# Altium schematic symbol library FPGA_Xilinx_Virtex6.SchLib: 28 symbols (part 1 of 15) (continued)
## XC6VHX250T-FF1154 (continued)
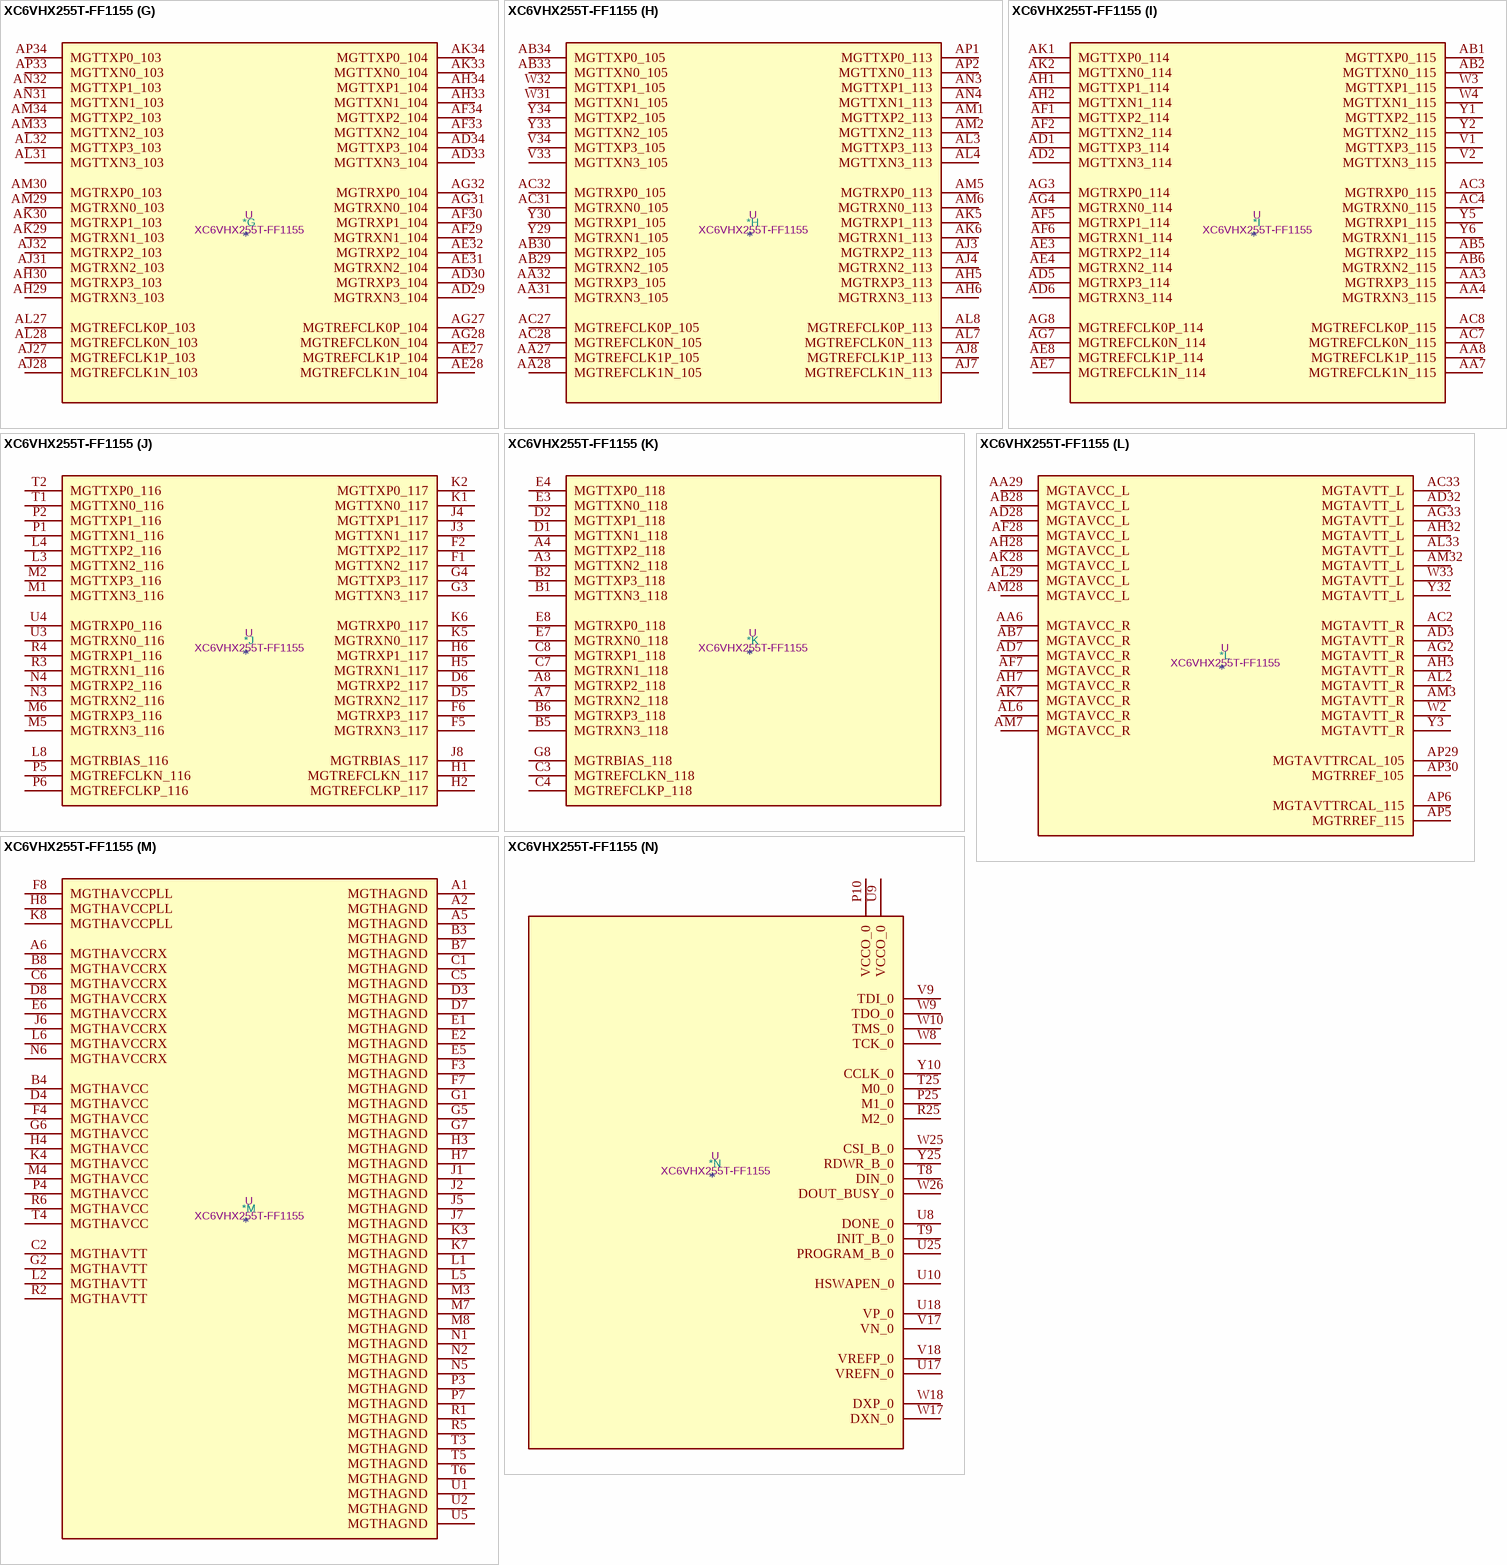
[diagram p4: symbol XC6VHX255T-FF1155]

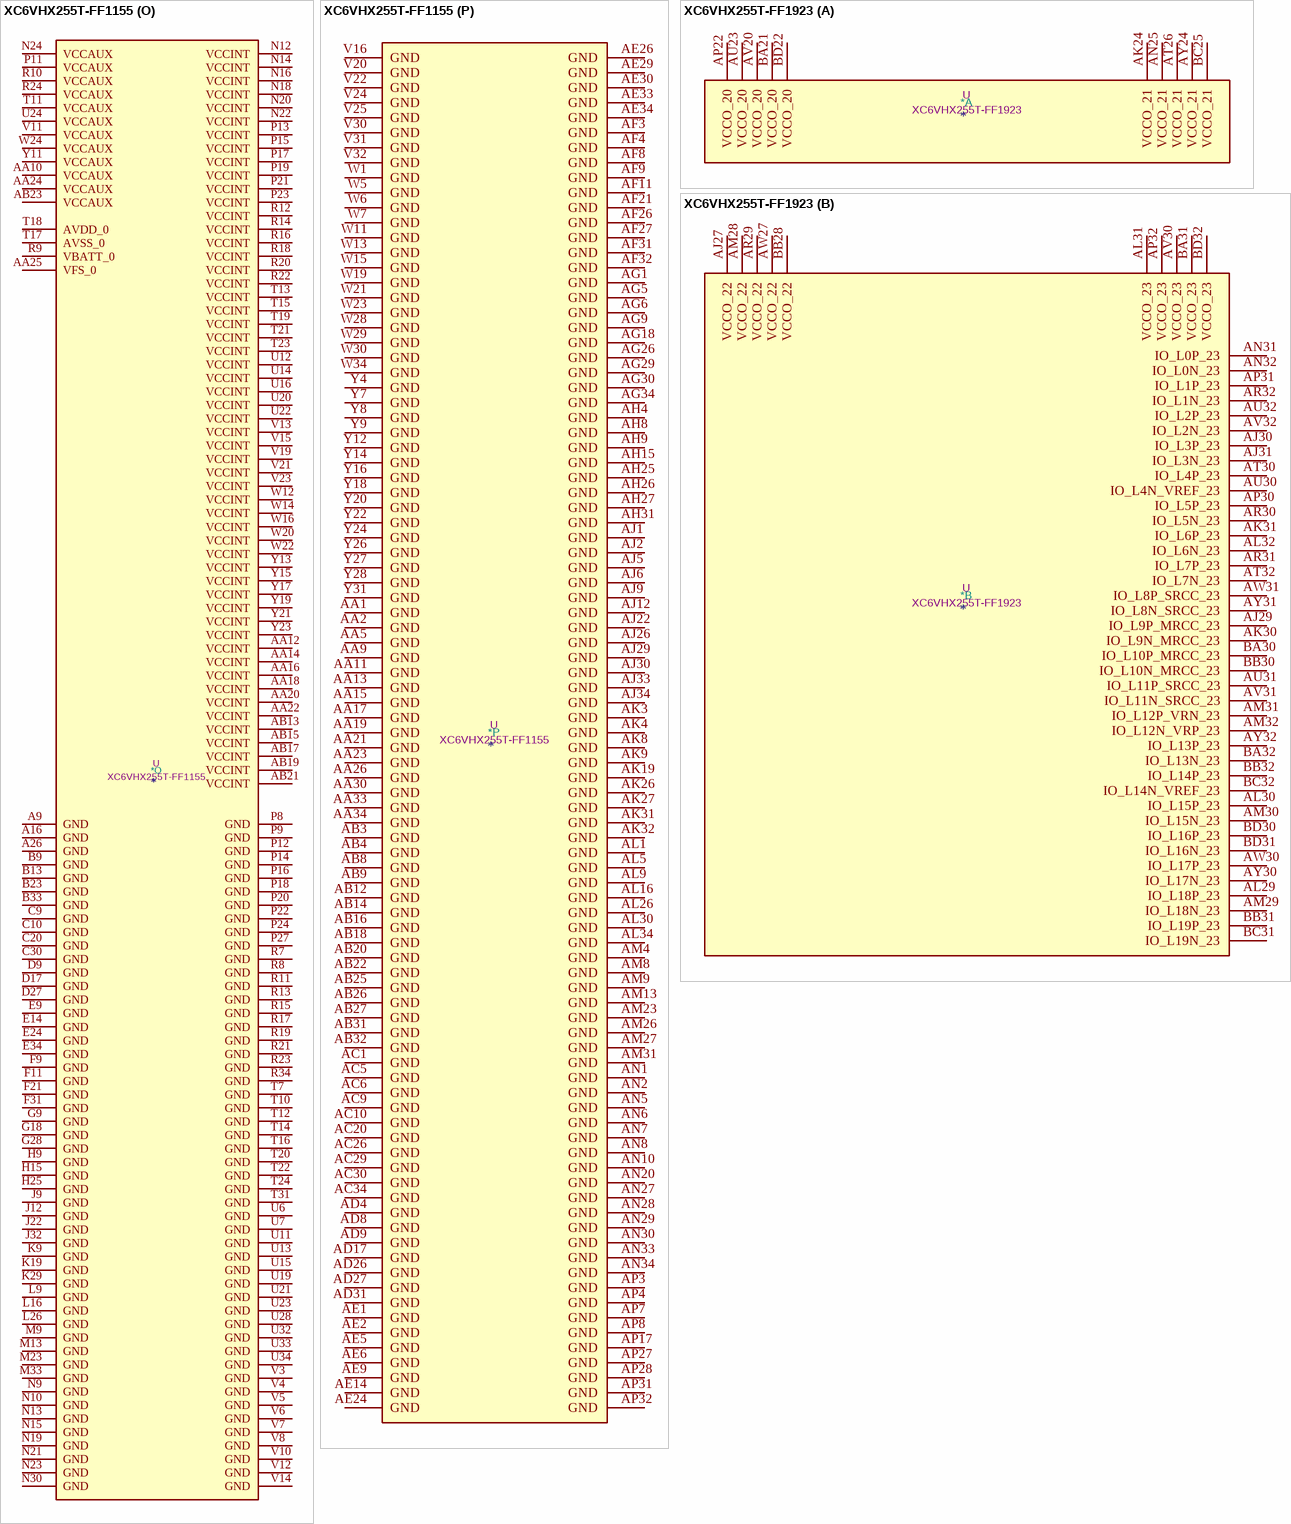
[diagram p5: symbols XC6VHX255T-FF1155 to XC6VHX255T-FF1923]

## XC6VHX255T-FF1155
designator *  value XC6VHX255T-FF1155  Reference: U
ki_keywords: FPGA; ki_description: Virtex 6 HXT 255 XC6VHX255T-FF1155
part A pins: AB24 IO_L4P_D11_24, AC18 IO_L19P_23, AC19 IO_L19N_23, AC21 IO_L4P_23, AC22 IO_L7P_D5_24, AC23 IO_L7N_D4_24, AC24 IO_L4N_VREF_D10_24, AC25 VCCO_24, AD18 IO_L17P_23, AD19 IO_L12P_VRN_23, AD20 IO_L12N_VRP_23, AD21 IO_L4N_VREF_23, AD22 VCCO_24, AD23 IO_L5P_D9_24, AD24 IO_L19P_24, AD25 IO_L19N_24, AE18 IO_L17N_23, AE19 VCCO_23, AE20 IO_L5P_23, AE21 IO_L5N_23, AE22 IO_L9P_MRCC_24, AE23 IO_L5N_D8_24, AE25 IO_L0P_GC_24, AF18 IO_L13P_23, AF19 IO_L13N_23, AF20 IO_L10P_MRCC_23, AF22 IO_L17P_VRN_24, AF23 IO_L9N_MRCC_24, AF24 IO_L2P_D15_24, AF25 IO_L0N_GC_24, AG19 IO_L9P_MRCC_23, AG20 IO_L10N_MRCC_23, AG21 IO_L1P_23, AG22 IO_L17N_VRP_24, AG23 VCCO_24, AG24 IO_L12P_D3_24, AG25 IO_L2N_D14_24, AH18 IO_L15P_23, AH19 IO_L9N_MRCC_23, AH20 VCCO_23, AH21 IO_L1N_23, AH22 IO_L11P_SRCC_24, AH23 IO_L11N_SRCC_24, AH24 IO_L12N_D2_FS2_24, AJ18 IO_L15N_23, AJ19 IO_L14P_23, AJ20 IO_L14N_VREF_23, AJ21 IO_L0P_23, AJ23 IO_L14P_FCS_B_24, AJ24 IO_L14N_VREF_FOE_B_MOSI_24, AJ25 IO_L6P_D7_24, AK18 IO_L11P_SRCC_23, AK20 IO_L8P_SRCC_23, AK21 IO_L0N_23, AK22 IO_L13P_D1_FS1_24, AK23 IO_L13N_D0_FS0_24, AK24 VCCO_24, AK25 IO_L6N_D6_24, AL18 IO_L11N_SRCC_23, AL19 IO_L7P_23, AL20 IO_L8N_SRCC_23, AL21 VCCO_23, AL22 IO_L15P_FWE_B_24, AL23 IO_L3P_D13_24, AL24 IO_L3N_D12_24, AL25 IO_L1P_GC_24, AM18 VCCO_23, AM19 IO_L7N_23, AM20 IO_L6P_23, AM21 IO_L2P_23, AM22 IO_L15N_RS1_24, AM24 IO_L16P_RS0_24, AM25 IO_L1N_GC_24, AN18 IO_L18P_23, AN19 IO_L3P_23, AN21 IO_L6N_23, AN22 IO_L2N_23, AN23 IO_L18P_24, AN24 IO_L16N_CSO_B_24, AN25 VCCO_24, AN26 IO_L8P_SRCC_24, AP18 IO_L18N_23, AP19 IO_L3N_23, AP20 IO_L16P_23, AP21 IO_L16N_23, AP22 VCCO_23, AP23 IO_L18N_24, AP24 IO_L10P_MRCC_24, AP25 IO_L10N_MRCC_24, AP26 IO_L8N_SRCC_24
part B pins: B34 IO_L9N_MRCC_26, C32 IO_L1N_26, C33 IO_L9P_MRCC_26, C34 IO_L0N_26, D31 IO_L1P_26, D32 VCCO_26, D33 IO_L0P_26, D34 IO_L8N_SRCC_26, E31 IO_L3P_26, E32 IO_L3N_26, E33 IO_L8P_SRCC_26, F32 IO_L5N_26, F33 IO_L7N_26, F34 IO_L10N_MRCC_26, G31 IO_L5P_26, G32 IO_L7P_26, G33 VCCO_26, G34 IO_L10P_MRCC_26, H31 IO_L11N_SRCC_26, H32 IO_L2P_26, H33 IO_L2N_26, H34 IO_L12N_VRP_26, J31 IO_L11P_SRCC_26, J33 IO_L6N_26, J34 IO_L12P_VRN_26, K28 IO_L4N_VREF_26, K30 IO_L17N_26, K31 IO_L13P_26, K32 IO_L13N_26, K33 IO_L6P_26, K34 VCCO_26, L27 IO_L4P_26, L28 IO_L15P_26, L29 IO_L15N_26, L30 IO_L17P_26, L31 VCCO_26, L32 IO_L16N_26, L33 IO_L14P_26, L34 IO_L14N_VREF_26, M26 IO_L19P_26, M27 IO_L19N_26, M28 VCCO_26, M29 IO_L18P_26, M30 IO_L18N_26, M31 IO_L16P_26, M32 IO_L0N_25, M34 IO_L5N_SM10N_25, N25 VCCO_25, N26 IO_L17N_25, N27 IO_L4P_25, N28 IO_L4N_VREF_25, N29 IO_L8N_SRCC_25, N31 IO_L12N_SM13N_25, N32 IO_L0P_25, N33 IO_L1N_25, N34 IO_L5P_SM10P_25, P26 IO_L17P_25, P28 IO_L2N_SM8N_25, P29 IO_L8P_SRCC_25, P30 IO_L3N_SM9N_25, P31 IO_L12P_SM13P_25, P32 VCCO_25, P33 IO_L1P_25, P34 IO_L9N_MRCC_25, R26 IO_L6P_SM11P_25, R27 IO_L6N_SM11N_25, R28 IO_L2P_SM8P_25, R29 VCCO_25, R30 IO_L3P_SM9P_25, R31 IO_L16P_VRN_25, R32 IO_L16N_VRP_25, R33 IO_L9P_MRCC_25, T26 VCCO_25, T27 IO_L11P_SRCC_25, T28 IO_L11N_SRCC_25, T29 IO_L7P_SM12P_25, T30 IO_L7N_SM12N_25, T32 IO_L10N_MRCC_25, T33 IO_L13P_SM14P_25, T34 IO_L13N_SM14N_25, U26 IO_L14P_25, U27 IO_L14N_VREF_25, U29 IO_L15P_SM15P_25, U30 IO_L15N_SM15N_25, U31 IO_L10P_MRCC_25, V26 IO_L18P_GC_25, V27 IO_L18N_GC_25, V28 IO_L19P_GC_25, V29 IO_L19N_GC_25, W27 VCCO_25
part C pins: A27 IO_L0N_28, A28 IO_L2N_28, A29 IO_L7N_27, A30 IO_L9N_MRCC_27, A31 VCCO_27, A32 IO_L16N_27, A33 IO_L18P_27, A34 IO_L18N_27, B26 IO_L0P_28, B27 IO_L2P_28, B28 VCCO_28, B29 IO_L7P_27, B30 IO_L9P_MRCC_27, B31 IO_L14N_VREF_27, B32 IO_L16P_27, C26 IO_L9N_MRCC_28, C27 IO_L1P_28, C28 IO_L1N_28, C29 IO_L5N_27, C31 IO_L14P_27, D24 IO_L5P_28, D25 IO_L5N_28, D26 IO_L9P_MRCC_28, D28 IO_L5P_27, D29 IO_L11P_SRCC_27, D30 IO_L11N_SRCC_27, E25 IO_L13N_28, E26 IO_L15N_28, E27 IO_L11N_SRCC_28, E28 IO_L3N_27, E29 VCCO_27, E30 IO_L13N_27, F22 IO_L7P_28, F23 IO_L7N_28, F24 IO_L13P_28, F25 IO_L15P_28, F26 VCCO_28, F27 IO_L11P_SRCC_28, F28 IO_L3P_27, F29 IO_L13P_27, F30 IO_L6N_27, G20 IO_L3P_28, G21 IO_L3N_28, G22 IO_L6N_28, G23 VCCO_28, G24 IO_L8N_SRCC_28, G25 IO_L17P_28, G26 IO_L17N_28, G27 IO_L1N_27, G29 IO_L17N_27, G30 IO_L6P_27, H20 VCCO_28, H21 IO_L6P_28, H22 IO_L10N_MRCC_28, H23 IO_L8P_SRCC_28, H24 IO_L0N_27, H26 IO_L1P_27, H27 IO_L15P_27, H28 IO_L15N_27, H29 IO_L17P_27, H30 VCCO_27, J20 IO_L18N_28, J21 IO_L10P_MRCC_28, J23 IO_L12N_VRP_28, J24 IO_L0P_27, J25 IO_L2P_27, J26 IO_L2N_27, J27 VCCO_27, J28 IO_L10N_MRCC_27, J29 IO_L12P_VRN_27, J30 IO_L12N_VRP_27, K20 IO_L18P_28, K21 IO_L16P_28, K22 IO_L16N_28, K23 IO_L12P_VRN_28, K24 VCCO_27, K25 IO_L8P_SRCC_27, K26 IO_L8N_SRCC_27, K27 IO_L10P_MRCC_27, L20 IO_L19N_28, L21 VCCO_28, L22 IO_L14P_28, L23 IO_L14N_VREF_28, L24 IO_L4P_27, L25 IO_L4N_VREF_27, M20 IO_L19P_28, M21 IO_L4P_28, M22 IO_L4N_VREF_28, M24 IO_L19P_27, M25 IO_L19N_27
part D pins: AB10 IO_L4N_VREF_35, AB11 IO_L4P_35, AC11 IO_L19P_GC_35, AC12 IO_L18N_GC_35, AC13 IO_L18P_GC_35, AC14 IO_L4P_A11_D27_34, AC15 VCCO_34, AC16 IO_L19N_VRP_34, AC17 IO_L19P_VRN_34, AD10 IO_L0P_35, AD11 IO_L19N_GC_35, AD12 VCCO_35, AD13 IO_L16P_VRN_35, AD14 IO_L4N_VREF_A10_D26_34, AD15 IO_L18N_A16_34, AD16 IO_L18P_A17_34, AE10 IO_L0N_35, AE11 IO_L3N_SM1N_35, AE12 IO_L3P_SM1P_35, AE13 IO_L16N_VRP_35, AE15 IO_L5P_A09_D25_34, AE16 IO_L16N_A20_34, AE17 IO_L16P_A21_34, AF10 IO_L2P_SM0P_35, AF12 IO_L13N_SM6N_35, AF13 IO_L13P_SM6P_35, AF14 IO_L1P_GC_34, AF15 IO_L5N_A08_D24_34, AF16 VCCO_34, AF17 IO_L14P_A25_34, AG10 IO_L2N_SM0N_35, AG11 IO_L1N_35, AG12 IO_L1P_35, AG13 VCCO_35, AG14 IO_L1N_GC_34, AG15 IO_L9N_MRCC_34, AG16 IO_L9P_MRCC_34, AG17 IO_L14N_VREF_A24_34, AH10 VCCO_35, AH11 IO_L5P_SM2P_35, AH12 IO_L11N_SRCC_35, AH13 IO_L11P_SRCC_35, AH14 IO_L2P_A15_D31_34, AH16 IO_L12N_A02_D18_34, AH17 IO_L12P_A03_D19_34, AJ10 IO_L6P_SM3P_35, AJ11 IO_L5N_SM2N_35, AJ13 IO_L0P_GC_34, AJ14 IO_L2N_A14_D30_34, AJ15 IO_L10P_MRCC_34, AJ16 IO_L11P_SRCC_34, AJ17 VCCO_34, AK10 IO_L6N_SM3N_35, AK11 IO_L7N_SM4N_35, AK12 IO_L7P_SM4P_35, AK13 IO_L0N_GC_34, AK14 VCCO_34, AK15 IO_L10N_MRCC_34, AK16 IO_L11N_SRCC_34, AK17 IO_L17P_A19_34, AL10 IO_L8P_SRCC_35, AL11 VCCO_35, AL12 IO_L15N_SM7N_35, AL13 IO_L15P_SM7P_35, AL14 IO_L3P_A13_D29_34, AL15 IO_L7P_A05_D21_34, AL17 IO_L17N_A18_34, AM10 IO_L8N_SRCC_35, AM11 IO_L9N_MRCC_35, AM12 IO_L9P_MRCC_35, AM14 IO_L3N_A12_D28_34, AM15 IO_L7N_A04_D20_34, AM16 IO_L13P_A01_D17_34, AM17 IO_L15P_A23_34, AN9 IO_L10P_MRCC_35, AN11 IO_L12P_SM5P_35, AN12 IO_L14P_35, AN13 IO_L17P_35, AN14 IO_L6P_A07_D23_34, AN15 VCCO_34, AN16 IO_L13N_A00_D16_34, AN17 IO_L15N_A22_34, AP9 IO_L10N_MRCC_35, AP10 IO_L12N_SM5N_35, AP11 IO_L14N_VREF_35, AP12 VCCO_35, AP13 IO_L17N_35, AP14 IO_L6N_A06_D22_34, AP15 IO_L8N_SRCC_34, AP16 IO_L8P_SRCC_34
part E pins: A10 IO_L10N_MRCC_36, A11 VCCO_36, A12 IO_L9N_MRCC_36, A13 IO_L7N_36, A14 IO_L7P_36, A15 IO_L12N_VRP_37, A17 IO_L17N_37, A18 IO_L11N_SRCC_37, A19 IO_L5N_37, A20 IO_L3N_37, A21 VCCO_37, A22 IO_L7N_37, B10 IO_L10P_MRCC_36, B11 IO_L6N_36, B12 IO_L9P_MRCC_36, B14 IO_L14N_VREF_37, B15 IO_L12P_VRN_37, B16 IO_L15N_37, B17 IO_L17P_37, B18 VCCO_37, B19 IO_L11P_SRCC_37, B20 IO_L5P_37, B21 IO_L3P_37, B22 IO_L7P_37, C11 IO_L8N_SRCC_36, C12 IO_L6P_36, C13 IO_L5N_36, C14 IO_L14P_37, C15 VCCO_37, C16 IO_L15P_37, C17 IO_L13N_37, C18 IO_L13P_37, D10 IO_L12N_VRP_36, D11 IO_L8P_SRCC_36, D12 VCCO_36, D13 IO_L5P_36, D14 IO_L0N_37, D15 IO_L0P_37, D16 IO_L9N_MRCC_37, E10 IO_L12P_VRN_36, E11 IO_L11N_SRCC_36, E12 IO_L11P_SRCC_36, E13 IO_L3N_36, E15 IO_L2N_37, E16 IO_L9P_MRCC_37, F10 IO_L14N_VREF_36, F12 IO_L13N_36, F13 IO_L3P_36, F14 IO_L6N_37, F15 IO_L2P_37, F16 VCCO_37, G10 IO_L14P_36, G11 IO_L2N_36, G12 IO_L13P_36, G13 VCCO_36, G14 IO_L8N_SRCC_37, G15 IO_L6P_37, G16 IO_L1N_37, H10 VCCO_36, H11 IO_L15N_36, H12 IO_L2P_36, H13 IO_L1N_36, H14 IO_L8P_SRCC_37, H16 IO_L1P_37, J10 IO_L16N_36, J11 IO_L15P_36, J13 IO_L1P_36, J14 IO_L10N_MRCC_37, J15 IO_L10P_MRCC_37, J16 IO_L4N_VREF_37, K10 IO_L16P_36, K11 IO_L17N_36, K12 IO_L17P_36, K13 IO_L4N_VREF_36, K14 VCCO_37, K15 IO_L16N_37, K16 IO_L4P_37, L10 IO_L18N_36, L11 VCCO_36, L12 IO_L0N_36, L13 IO_L4P_36, L14 IO_L18N_37, L15 IO_L16P_37, M10 IO_L18P_36, M11 IO_L19N_36, M12 IO_L0P_36, M14 IO_L18P_37, M15 IO_L19N_37, M16 IO_L19P_37, N11 IO_L19P_36
part F pins: A23 IO_L5P_38, A24 IO_L5N_38, A25 IO_L3N_38, B24 IO_L1N_38, B25 IO_L3P_38, C19 IO_L2N_38, C21 IO_L9P_MRCC_38, C22 IO_L9N_MRCC_38, C23 IO_L11N_SRCC_38, C24 IO_L1P_38, C25 VCCO_38, D18 IO_L2P_38, D19 IO_L7P_38, D20 IO_L7N_38, D21 IO_L13N_38, D22 VCCO_38, D23 IO_L11P_SRCC_38, E17 IO_L0P_38, E18 IO_L0N_38, E19 VCCO_38, E20 IO_L13P_38, E21 IO_L17N_38, E22 IO_L15P_38, E23 IO_L15N_38, F17 IO_L4N_VREF_38, F18 IO_L6P_38, F19 IO_L6N_38, F20 IO_L17P_38, G17 IO_L4P_38, G19 IO_L8N_SRCC_38, H17 IO_L10P_MRCC_38, H18 IO_L10N_MRCC_38, H19 IO_L8P_SRCC_38, J17 VCCO_38, J18 IO_L12P_VRN_38, J19 IO_L12N_VRP_38, K17 IO_L16N_38, K18 IO_L19N_38, L17 IO_L16P_38, L18 IO_L19P_38, L19 IO_L14N_VREF_38, M17 IO_L18N_38, M18 VCCO_38, M19 IO_L14P_38, N17 IO_L18P_38
part G pins: AD29 MGTRXN3_104, AD30 MGTRXP3_104, AD33 MGTTXN3_104, AD34 MGTTXP3_104, AE27 MGTREFCLK1P_104, AE28 MGTREFCLK1N_104, AE31 MGTRXN2_104, AE32 MGTRXP2_104, AF29 MGTRXN1_104, AF30 MGTRXP1_104, AF33 MGTTXN2_104, AF34 MGTTXP2_104, AG27 MGTREFCLK0P_104, AG28 MGTREFCLK0N_104, AG31 MGTRXN0_104, AG32 MGTRXP0_104, AH29 MGTRXN3_103, AH30 MGTRXP3_103, AH33 MGTTXN1_104, AH34 MGTTXP1_104, AJ27 MGTREFCLK1P_103, AJ28 MGTREFCLK1N_103, AJ31 MGTRXN2_103, AJ32 MGTRXP2_103, AK29 MGTRXN1_103, AK30 MGTRXP1_103, AK33 MGTTXN0_104, AK34 MGTTXP0_104, AL27 MGTREFCLK0P_103, AL28 MGTREFCLK0N_103, AL31 MGTTXN3_103, AL32 MGTTXP3_103, AM29 MGTRXN0_103, AM30 MGTRXP0_103, AM33 MGTTXN2_103, AM34 MGTTXP2_103, AN31 MGTTXN1_103, AN32 MGTTXP1_103, AP33 MGTTXN0_103, AP34 MGTTXP0_103
part H pins: AA27 MGTREFCLK1P_105, AA28 MGTREFCLK1N_105, AA31 MGTRXN3_105, AA32 MGTRXP3_105, AB29 MGTRXN2_105, AB30 MGTRXP2_105, AB33 MGTTXN0_105, AB34 MGTTXP0_105, AC27 MGTREFCLK0P_105, AC28 MGTREFCLK0N_105, AC31 MGTRXN0_105, AC32 MGTRXP0_105, AH5 MGTRXP3_113, AH6 MGTRXN3_113, AJ3 MGTRXP2_113, AJ4 MGTRXN2_113, AJ7 MGTREFCLK1N_113, AJ8 MGTREFCLK1P_113, AK5 MGTRXP1_113, AK6 MGTRXN1_113, AL3 MGTTXP3_113, AL4 MGTTXN3_113, AL7 MGTREFCLK0N_113, AL8 MGTREFCLK0P_113, AM1 MGTTXP2_113, AM2 MGTTXN2_113, AM5 MGTRXP0_113, AM6 MGTRXN0_113, AN3 MGTTXP1_113, AN4 MGTTXN1_113, AP1 MGTTXP0_113, AP2 MGTTXN0_113, V33 MGTTXN3_105, V34 MGTTXP3_105, W31 MGTTXN1_105, W32 MGTTXP1_105, Y29 MGTRXN1_105, Y30 MGTRXP1_105, Y33 MGTTXN2_105, Y34 MGTTXP2_105
part I pins: AA3 MGTRXP3_115, AA4 MGTRXN3_115, AA7 MGTREFCLK1N_115, AA8 MGTREFCLK1P_115, AB1 MGTTXP0_115, AB2 MGTTXN0_115, AB5 MGTRXP2_115, AB6 MGTRXN2_115, AC3 MGTRXP0_115, AC4 MGTRXN0_115, AC7 MGTREFCLK0N_115, AC8 MGTREFCLK0P_115, AD1 MGTTXP3_114, AD2 MGTTXN3_114, AD5 MGTRXP3_114, AD6 MGTRXN3_114, AE3 MGTRXP2_114, AE4 MGTRXN2_114, AE7 MGTREFCLK1N_114, AE8 MGTREFCLK1P_114, AF1 MGTTXP2_114, AF2 MGTTXN2_114, AF5 MGTRXP1_114, AF6 MGTRXN1_114, AG3 MGTRXP0_114, AG4 MGTRXN0_114, AG7 MGTREFCLK0N_114, AG8 MGTREFCLK0P_114, AH1 MGTTXP1_114, AH2 MGTTXN1_114, AK1 MGTTXP0_114, AK2 MGTTXN0_114, V1 MGTTXP3_115, V2 MGTTXN3_115, W3 MGTTXP1_115, W4 MGTTXN1_115, Y1 MGTTXP2_115, Y2 MGTTXN2_115, Y5 MGTRXP1_115, Y6 MGTRXN1_115
part J pins: D5 MGTRXN2_117, D6 MGTRXP2_117, F1 MGTTXN2_117, F2 MGTTXP2_117, F5 MGTRXN3_117, F6 MGTRXP3_117, G3 MGTTXN3_117, G4 MGTTXP3_117, H1 MGTREFCLKN_117, H2 MGTREFCLKP_117, H5 MGTRXN1_117, H6 MGTRXP1_117, J3 MGTTXN1_117, J4 MGTTXP1_117, J8 MGTRBIAS_117, K1 MGTTXN0_117, K2 MGTTXP0_117, K5 MGTRXN0_117, K6 MGTRXP0_117, L3 MGTTXN2_116, L4 MGTTXP2_116, L8 MGTRBIAS_116, M1 MGTTXN3_116, M2 MGTTXP3_116, M5 MGTRXN3_116, M6 MGTRXP3_116, N3 MGTRXN2_116, N4 MGTRXP2_116, P1 MGTTXN1_116, P2 MGTTXP1_116, P5 MGTREFCLKN_116, P6 MGTREFCLKP_116, R3 MGTRXN1_116, R4 MGTRXP1_116, T1 MGTTXN0_116, T2 MGTTXP0_116, U3 MGTRXN0_116, U4 MGTRXP0_116